# Altium footprint library bs_libs.PcbLib: 95 footprints (part 3 of 6)
Each footprint in its own frame and in the unit in brackets; x right, y up, seen from the top. Pads: shape width x height; smd on the part's side, far side on the other; paste and mask are expansions set on the pad; w line width, h text height; cw(c..) or ccw(c..) is an arc to the next point about the centre after c.
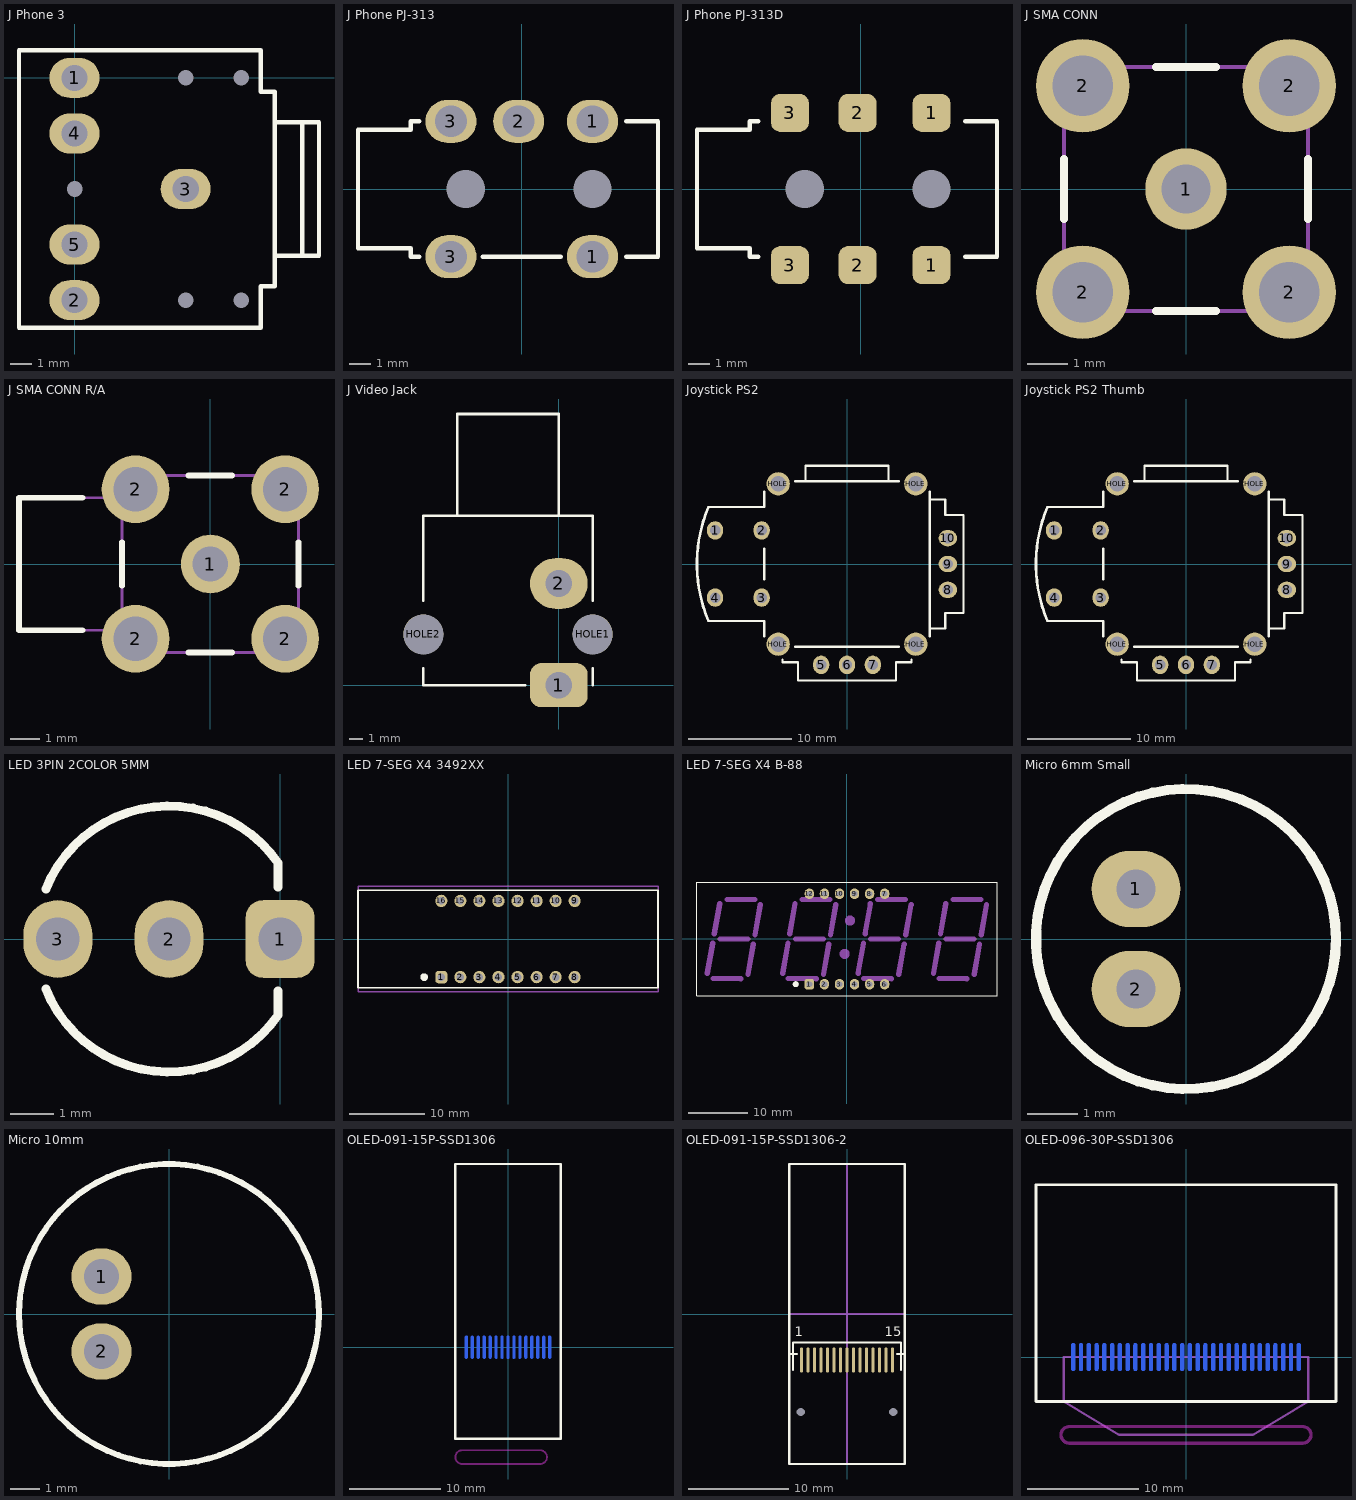
[diagram p2: the footprints below, top view; thin cyan lines are the x and y axes]

## J Phone 3 [mil] "Jack Phone 3-pole 5-pin"
pads (10):
  oval 90x72 hole 47.24: 1(0,0) 2(0,-400) 3(200,-200) 4(0,-100) 5(0,-300)
  round 0 hole 28: H1(0,-200) H1(200,-400) H1(200,0) H1(300,-400) H1(300,0)
Top Overlay:
  lines w8: 360,-320 440,-320 440,-80 360,-80 ; 410,-320 410,-80 ; -100,-450 -100,50 335,50 335,-25 360,-25 360,-375 335,-375 335,-450 -100,-450
3D body "User Library-CONNECTOR  PHONE JACK  STEREO  3_5 MM  SEE-PLUS ST-3536-02HG.step": height 413.78, standoff -117.72, extent -105.12,-436.22 450,36.22

## J Phone PJ-313 [mm] "Jack Phone 3-pole 5-pin"
pads (7):
  oval 2.413x2.032 hole 1.5: 1(3.35,-3.2) 1(3.35,3.2) 2(-0.15,3.2) 3(-3.35,-3.2) 3(-3.35,3.2)
  round 0 hole 1.8: HOLE(-2.65,0) HOLE(3.35,0)
Top Overlay:
  lines w0.203: -4.85,-3.2 -5.25,-3.2 -5.25,-2.8 -7.75,-2.8 -7.75,2.8 -5.25,2.8 -5.25,3.2 -4.85,3.2 ; -1.85,-3.2 1.85,-3.2 ; 4.95,-3.2 6.45,-3.2 6.45,3.2 4.95,3.2
3D body: height 5.64, standoff 4.35, extent -4,-3.6 -2.7,-2.303
3D body: height 5.64, standoff 4.35, extent 2.7,-3.6 4,-2.303
3D body: height 5.64, standoff 4.35, extent 2.7,2.303 4,3.6
3D body: height 5.64, standoff 4.35, extent -0.8,2.303 0.5,3.6
3D body: height 5.64, standoff 4.35, extent -4,2.303 -2.7,3.6
3D body: height 6, standoff 0, extent -5.15,-3.1 6.35,3.1
3D body: height 5.58, standoff 0.2, extent -7.65,-2.695 -5.15,2.695
3D body: height 5, standoff -1, extent -4,2.8 -2.7,3.6
3D body: height 5, standoff -1, extent -0.8,2.8 0.5,3.6
3D body: height 5, standoff -1, extent 2.7,2.8 4,3.6
3D body: height 5, standoff -1, extent 2.7,-3.6 4,-2.8
3D body: height 5, standoff -1, extent -4,-3.6 -2.7,-2.8

## J Phone PJ-313D [mm] "Jack Phone 3-pole 5-pin"
pads (8):
  rrect50% 1.8x1.8 smd: 1(3.35,-3.6) 1(3.35,3.6) 2(-0.15,-3.6) 2(-0.15,3.6) 3(-3.35,-3.6) 3(-3.35,3.6)
  round 0 hole 1.8: HOLE(-2.65,0) HOLE(3.35,0)
Top Overlay:
  lines w0.203: -4.85,-3.2 -5.25,-3.2 -5.25,-2.8 -7.75,-2.8 -7.75,2.8 -5.25,2.8 -5.25,3.2 -4.85,3.2 ; 4.95,-3.2 6.45,-3.2 6.45,3.2 4.95,3.2
3D body: height 6, standoff 0, extent -5.15,-3.1 6.35,3.1
3D body: height 5.58, standoff 0.2, extent -7.65,-2.695 -5.15,2.695

## J SMA CONN [mm] "Connector; RF Coaxial, MCX, Thru-Hole; 5 Position; Right Angle"
height 5.99
pads (5):
  round 2 hole 1.2: 1(0,0)
  round 2.3 hole 1.5: 2(-2.54,-2.54) 2(-2.54,2.54) 2(2.54,-2.54) 2(2.54,2.54)
Top Overlay:
  lines w0.2: -3,-0.74 -3,0.74 ; -0.74,-3 0.74,-3 ; -0.74,3 0.74,3 ; 3,-0.74 3,0.74
Mechanical 13:
  lines w0.1: -3,-3 3,-3 3,3 -3,3 -3,-3
3D body "User Library-SMA_Stehend_Amp 132134RP-1.STEP": height 9.53, standoff -3.94, extent -3.444,-3.5 3.556,3.5

## J SMA CONN R/A [mm] "Connector; RF Coaxial, MCX, Thru-Hole; 5 Position; Right Angle"
height 5.99
pads (5):
  round 2 hole 1.2: 1(0,0)
  round 2.3 hole 1.5: 2(-2.54,-2.54) 2(-2.54,2.54) 2(2.54,-2.54) 2(2.54,2.54)
Top Overlay:
  lines w0.2: -4.34,-2.25 -6.5,-2.25 -6.5,2.25 -4.34,2.25 ; -3,-0.74 -3,0.74 ; -0.74,-3 0.74,-3 ; -0.74,3 0.74,3 ; 3,-0.74 3,0.74
Mechanical 13:
  lines w0.1: -3,-2.25 -6.5,-2.25 -6.5,2.25 -3,2.25 ; -3,-3 3,-3 3,3 -3,3 -3,-3
3D body "User Library-919-119J-51AX.step": height 5.9, standoff -3.94, extent -6.5,-3 3,3

## J Video Jack [mil] "CFC UBEC 5V/3A Switching Module"
pads (4):
  rrect50% 170x130 hole 79: 1(0,0)
  oval 170x150 hole 79: 2(0,300)
  round 118 hole 118: HOLE1(100,150) HOLE2(-400,150)
Top Overlay:
  lines w8: -400,50 -400,0 -100,0 ; -400,250 -400,500 100,500 100,250 ; -300,500 -300,800 0,800 0,500 ; 100,0 100,50
3D body "User Library-Tulip Jack (W R Y).step": height 472.44, standoff -196.85, extent -346.85,50 46.85,813.78

## Joystick PS2 [mm]
pads (14):
  oval 1.575x1.778 hole 1: 1(-12.75,3.25) 2(-8.25,3.25) 3(-8.25,-3.25) 4(-12.75,-3.25) 5(-2.5,-9.75) 6(0,-9.75) 7(2.5,-9.75)
  oval 1.778x1.575 hole 1: 8(9.75,-2.5) 9(9.75,0) 10(9.75,2.5)
  round 2.246 hole 1.5: HOLE(-6.65,-7.75) HOLE(-6.65,7.75) HOLE(6.65,-7.75) HOLE(6.65,7.75)
Top Overlay:
  lines w0.203: -13.428,-5.5 -8,-5.5 -8,-7 ; -13.428,5.5 -8,5.5 -8,7 ; -8,-1.5 -8,1.5 ; -6.25,-9.25 -6.25,-9.5 -4.75,-9.5 -4.75,-11.25 4.75,-11.25 4.75,-9.5 6.25,-9.5 6.25,-9.25 ; -5,-8 5,-8 ; -5,8 5,8 ; -4,8 -4,9.5 4,9.5 4,8 ; 8,-7 8,7 ; 8,-6.25 9.5,-6.25 9.5,-4.75 11.25,-4.75 11.25,4.75 9.5,4.75 9.5,6.25 8,6.25
  lines w0.254: -13.428,-5.471 cw(c0,0) -13.428,5.471
3D body "User Library-alps joystick module.step": height 19, standoff -4.3, extent -16.026,-11.85 11.85,9.45

## Joystick PS2 Thumb [mm]
pads (14):
  oval 1.575x1.778 hole 1: 1(-12.75,3.25) 2(-8.25,3.25) 3(-8.25,-3.25) 4(-12.75,-3.25) 5(-2.5,-9.75) 6(0,-9.75) 7(2.5,-9.75)
  oval 1.778x1.575 hole 1: 8(9.75,-2.5) 9(9.75,0) 10(9.75,2.5)
  round 2.246 hole 1.5: HOLE(-6.65,-7.75) HOLE(-6.65,7.75) HOLE(6.65,-7.75) HOLE(6.65,7.75)
Top Overlay:
  lines w0.203: -13.428,-5.5 -8,-5.5 -8,-7 ; -13.428,5.5 -8,5.5 -8,7 ; -8,-1.5 -8,1.5 ; -6.25,-9.25 -6.25,-9.5 -4.75,-9.5 -4.75,-11.25 4.75,-11.25 4.75,-9.5 6.25,-9.5 6.25,-9.25 ; -5,-8 5,-8 ; -5,8 5,8 ; -4,8 -4,9.5 4,9.5 4,8 ; 8,-7 8,7 ; 8,-6.25 9.5,-6.25 9.5,-4.75 11.25,-4.75 11.25,4.75 9.5,4.75 9.5,6.25 8,6.25
  lines w0.254: -13.428,-5.471 cw(c0,0) -13.428,5.471
3D body "User Library-Joystick_Asm_Left.STEP": height 28.61, standoff -3, extent -15.042,-13.222 13.169,13.076

## LED 3PIN 2COLOR 5MM [mil]
pads (3):
  rrect50% 62x70 hole 39: 1(0,0)
  oval 62x70 hole 39: 2(-100,0) 3(-200,0)
Top Overlay:
  lines w8: -210.87,-45.07 ccw(c-100,0) -1.95,-68.63 -1.95,-46.95 ; -210.87,45.07 cw(c-100,0) -1.95,68.63 -1.95,46.95
3D body "User Library-LED-5-mm.step": height 334.65, standoff -118.11, extent -218.11,-118.02 -1.58,118.03

## LED 7-SEG X4 3492XX [mm] "LED, 7-Segment Display, 14.22 mm, Four Digit, 88:88; 12 Leads; Row Space 15.24 mm; Pitch 2.54 mm"
height 8.26
pads (16):
  rrect50% 1.6x1.65 hole 1: 1(-8.89,-5.08)
  oval 1.6x1.65 hole 1: 2(-6.35,-5.08) 3(-3.81,-5.08) 4(-1.27,-5.08) 5(1.27,-5.08) 6(3.81,-5.08) 7(6.35,-5.08) 8(8.89,-5.08) 9(8.89,5.08) 10(6.35,5.08) 11(3.81,5.08) 12(1.27,5.08) 13(-1.27,5.08) 14(-3.81,5.08) 15(-6.35,5.08) 16(-8.89,5.08)
Top Overlay:
  circle w0.508: c-11.176,-5.08 r0.254
  lines w0.203: -20,-6.5 -20,6.5 20,6.5 20,-6.5 -20,-6.5
Mechanical 1:
  lines w0.2: -20,-7 20,-7 20,7 -20,7 -20,-7
3D body "LED_Display_KYX-3492BS.step": height 7.05, standoff -2, extent -20.1,-6.4 20.1,6.4

## LED 7-SEG X4 B-88 [mil] "LED, 7-Segment Display, 14.22 mm, Four Digit, 88:88; 12 Leads; Row Space 15.24 mm; Pitch 2.54 mm"
height 325.2
pads (12):
  rrect50% 62x70 hole 39: 1(-250,-300)
  oval 62x70 hole 39: 2(-150,-300) 3(-50,-300) 4(50,-300) 5(150,-300) 6(250,-300) 7(250,300) 8(150,300) 9(50,300) 10(-50,300) 11(-150,300) 12(-250,300)
Top Overlay:
  circle w20: c-340,-300 r10
  lines w8: -995,-375 995,-375 995,375 -995,375 -995,-375
Mechanical 1:
  circle w55.12: c-15.55,-98.43 r5.91
  circle w55.12: c19.88,122.05 r5.91
  lines w35.43: -926.38,-226.77 -890.94,-27.17 ; -888.58,-262.2 -704.72,-262.6 ; -879.92,35.43 -844.88,234.65 ; -842.13,0 -658.66,0 ; -796.46,262.2 -612.6,262.2 ; -656.3,-234.25 -621.26,-35.43 ; -609.84,27.95 -574.8,226.77 ; -426.38,-226.77 -390.94,-27.17 ; -388.58,-262.2 -204.72,-262.6 ; -379.92,35.43 -344.88,234.65 ; -342.13,0 -158.66,0 ; -296.46,262.2 -112.6,262.2 ; -156.3,-234.25 -121.26,-35.43 ; -109.84,27.95 -74.8,226.77 ; 73.62,-226.77 109.06,-27.17 ; 111.42,-262.2 295.28,-262.6 ; 120.08,35.43 155.12,234.65 ; 157.87,0 341.34,0 ; 203.54,262.2 387.4,262.2 ; 343.7,-234.25 378.74,-35.43 ; 390.16,27.95 425.2,226.77 ; 573.62,-226.77 609.06,-27.17 ; 611.42,-262.2 795.28,-262.6 ; 620.08,35.43 655.12,234.65 ; 657.87,0 841.34,0 ; 703.54,262.2 887.4,262.2 ; 843.7,-234.25 878.74,-35.43 ; 890.16,27.95 925.2,226.77
3D body "User Library-7x4seg.STEP": height 374.65, standoff -117.48, extent -990.15,-374.01 990.16,374.02

## Micro 6mm Small [mil]
pads (2):
  oval 70x60 hole 31: 1(-39.37,39.37) 2(-39.37,-39.37)
Top Overlay:
  circle w8: c0,0 r118.11

## Micro 10mm [mil]
pads (2):
  oval 80x75 hole 47.24: 1(-90,50) 2(-90,-50)
Top Overlay:
  circle w8: c0,0 r200
3D body "cma-6542pf.stp": height 263.78, standoff -177.17, extent -190.94,-190.94 190.95,190.95

## OLED-091-15P-SSD1306 [mm]
pads (15):
  oval 0.3x2.5 smd far side: 1(-4.55,0) 2(-3.9,0) 3(-3.25,0) 4(-2.6,0) 5(-1.95,0) 6(-1.3,0) 7(-0.65,0) 8(0,0) 9(0.65,0) 10(1.3,0) 11(1.95,0) 12(2.6,0) 13(3.25,0) 14(3.9,0) 15(4.55,0)
Top Overlay:
  lines w0.25: -5.75,-10 5.75,-10 5.75,20 -5.75,20 -5.75,-10
Bottom Overlay:
  lines w0.2: -5.4,-1 -5.4,1.75 5.4,1.75 5.4,-1
  text "15" at 5.5,2 h1.6
  text "1" at -5,2 h1.6
Keep-Out Layer:
  lines w0.2: -5,-12.75 cw(c-5,-12) -5,-11.25 3.5,-11.25 cw(c3.5,-12) 3.5,-12.75 -5,-12.75
3D body: height 1.4, standoff 0, extent -5.75,-10 5.75,20
3D body: height 0.8, standoff 0, extent -5.5,-12 4,-9.75
3D body: height 0.8, standoff 0, extent -5.5,-12 5.5,-6

## OLED-091-15P-SSD1306-2 [mm]
pads (17):
  oval 0.3x2.5 smd: 1(-4.55,-4.6) 2(-3.9,-4.6) 3(-3.25,-4.6) 4(-2.6,-4.6) 5(-1.95,-4.6) 6(-1.3,-4.6) 7(-0.65,-4.6) 8(0,-4.6) 9(0.65,-4.6) 10(1.3,-4.6) 11(1.95,-4.6) 12(2.6,-4.6) 13(3.25,-4.6) 14(3.9,-4.6) 15(4.55,-4.6)
  round 0 hole 0.8 unplated: HOLE(-4.625,-9.8) HOLE(4.625,-9.8)
Top Overlay:
  lines w0.2: -5.75,-4 -5,-4 ; -5.4,-5.6 -5.4,-2.85 5.4,-2.85 5.4,-5.6 ; 5,-4 5.75,-4
  lines w0.25: -5.75,-15 -5.75,15 5.75,15 5.75,-15 -5.75,-15
  text "15" at 3.75,-2.6 h1.6
  text "1" at -5.25,-2.6 h1.6
Mechanical 1:
  lines w0.2: -5.75,0 0,0 ; 0,-15 0,0 ; 5.75,0 0,0 ; 0,0 0,0 ; 0,0 0,0 ; 0,0 0,0 ; 0,0 0,15 ; 0,15 0,15
3D body: height 0.8, standoff 0, extent -5.5,-17 5.6,-15
3D body: height 1.4, standoff 0, extent -5.75,-15 5.75,15

## OLED-096-30P-SSD1306 [mm]
pads (30):
  oval 0.35x2.5 smd far side: 1(-10.15,0) 2(-9.45,0) 3(-8.75,0) 4(-8.05,0) 5(-7.35,0) 6(-6.65,0) 7(-5.95,0) 8(-5.25,0) 9(-4.55,0) 10(-3.85,0) 11(-3.15,0) 12(-2.45,0) 13(-1.75,0) 14(-1.05,0) 15(-0.35,0) 16(0.35,0) 17(1.05,0) 18(1.75,0) 19(2.45,0) 20(3.15,0) 21(3.85,0) 22(4.55,0) 23(5.25,0) 24(5.95,0) 25(6.65,0) 26(7.35,0) 27(8.05,0) 28(8.75,0) 29(9.45,0) 30(10.15,0)
Top Overlay:
  lines w0.25: -13.5,-4 13.5,-4 13.5,15.5 -13.5,15.5 -13.5,-4
Bottom Overlay:
  lines w0.2: -11,-1 -11,1.75 11,1.75 11,-1
  text "1" at -10.5,2 h1.6
  text "30" at 11,2 h1.6
Keep-Out Layer:
  lines w0.3: -10.5,-7.75 cw(c-10.5,-7) -10.5,-6.25 10.5,-6.25 cw(c10.5,-7) 10.5,-7.75 -10.5,-7.75
Mechanical 5:
  lines w0.2: -6,-7 6,-7 ; -6,-7 -11,-4 -11,0 0,0 11,0 11,-4 6,-7 ; -6,-7 0,-7 6,-7
3D body: height 0.8, standoff 0, extent -11,-7 11,0
3D body: height 0.8, standoff 0, extent -6,-7 6,-3.75
3D body: height 1.4, standoff 0, extent -13.25,-3.75 13.25,15.25